# Altium footprint library Разъемы.PcbLib: 291 footprints (part 6 of 19)
Each footprint in its own frame and in the unit in brackets; x right, y up, seen from the top. Pads: shape width x height; smd on the part's side, far side on the other; paste and mask are expansions set on the pad; w line width, h text height; cw(c..) or ccw(c..) is an arc to the next point about the centre after c.
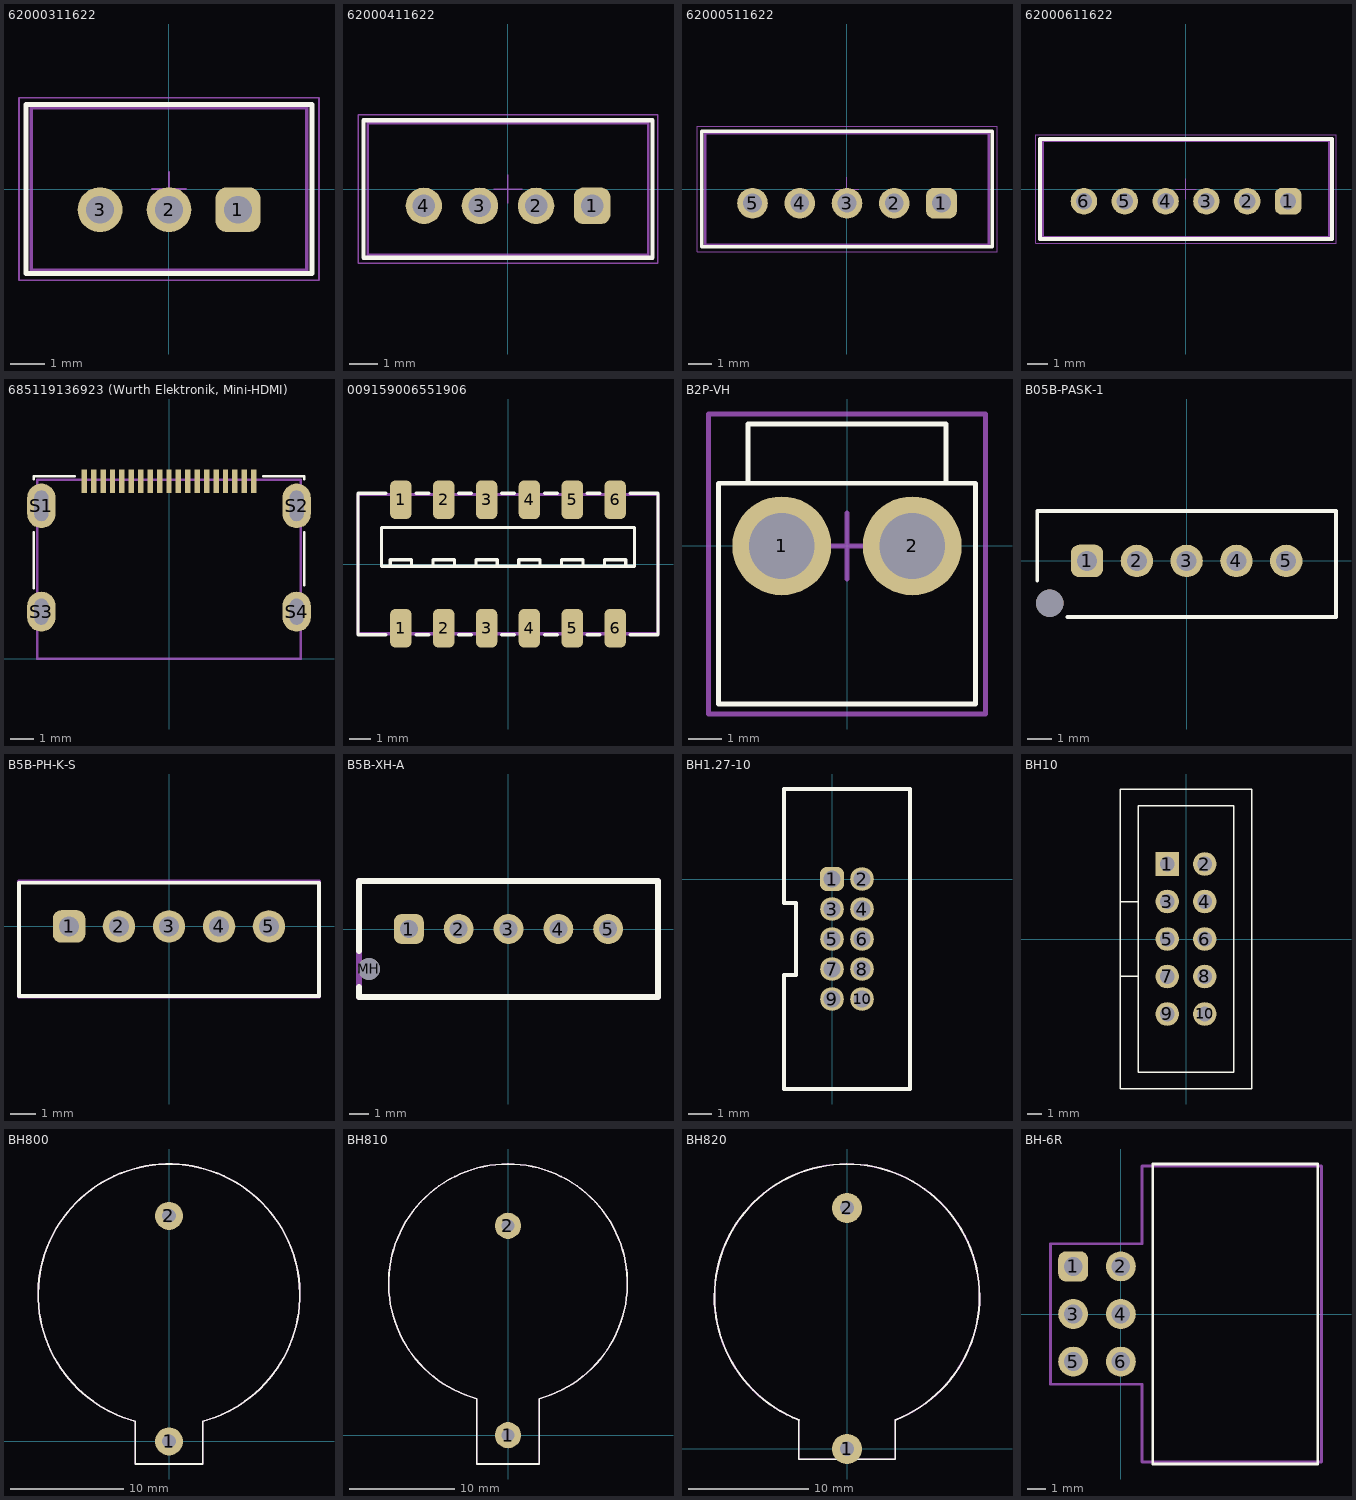
[diagram p5: the footprints below, top view; thin cyan lines are the x and y axes]

## 62000311622 [mm] "2.00mm Male Vertical Shrouded Header, 3p"
height 6.1
pads (3):
  rrect50% 1.3x1.3 hole 0.8: 1(2,-0.6)
  round 1.3 hole 0.8: 2(0,-0.6) 3(-2,-0.6)
Top Overlay:
  lines w0.15: -4.15,-2.45 -4.15,2.45 4.15,2.45 4.15,-2.45 -4.15,-2.45
  text "." at 2.5,-3 h0.1
Top Courtyard:
  lines w0.05: -0.5,0 0.5,0 ; 0,-0.5 0,0.5 ; -4.35,-2.65 -4.35,2.65 4.35,2.65 4.35,-2.65 -4.35,-2.65
Top Designator:
  text ".Designator" at -3.999,-0.679 h0.8
Top Component Outline:
  lines w0.1: -4,-2.35 4,-2.35 4,2.35 -4,2.35 -4,-2.35
3D body "62000311622.stp": height 6.13, standoff -3.37, extent -4,-2.35 4,2.35

## 62000411622 [mm] "2.00mm Male Vertical Shrouded Header, 4p"
height 6.1
pads (4):
  rrect50% 1.3x1.3 hole 0.8: 1(3,-0.6)
  round 1.3 hole 0.8: 2(1,-0.6) 3(-1,-0.6) 4(-3,-0.6)
Top Overlay:
  lines w0.15: -5.15,-2.45 5.15,-2.45 5.15,2.45 -5.15,2.45 -5.15,-2.45
  text "." at 4,-3 h0.1
Top Courtyard:
  lines w0.05: -0.5,0 0.5,0 ; 0,-0.5 0,0.5 ; -5.35,-2.65 5.35,-2.65 5.35,2.65 -5.35,2.65 -5.35,-2.65
Top Component Outline:
  lines w0.1: -5,-2.35 -5,2.35 5,2.35 5,-2.35 -5,-2.35
3D body "62000411622.stp": height 6.13, standoff -3.37, extent -5,-2.35 5,2.35

## 62000511622 [mm] "2.00mm Male Vertical Shrouded Header, 5p"
height 6.1
pads (5):
  rrect50% 1.3x1.3 hole 0.8: 1(4,-0.6)
  round 1.3 hole 0.8: 2(2,-0.6) 3(0,-0.6) 4(-2,-0.6) 5(-4,-0.6)
Top Overlay:
  lines w0.15: -6.15,-2.45 -6.15,2.45 6.15,2.45 6.15,-2.45 -6.15,-2.45
  text "." at 4.5,-3 h0.1
Top Courtyard:
  lines w0.05: -0.5,0 0.5,0 ; 0,-0.5 0,0.5 ; -6.35,-2.65 -6.35,2.65 6.35,2.65 6.35,-2.65 -6.35,-2.65
Top Designator:
  text ".Designator" at -3.999,-0.679 h0.8
Top Component Outline:
  lines w0.1: -6,-2.35 6,-2.35 6,2.35 -6,2.35 -6,-2.35
3D body "62000511622.stp": height 6.13, standoff -3.37, extent -6,-2.35 6,2.35

## 62000611622 [mm] "2.00mm Male Vertical Shrouded Header, 6p"
height 6.1
pads (6):
  rrect50% 1.3x1.3 hole 0.8: 1(5,-0.6)
  round 1.3 hole 0.8: 2(3,-0.6) 3(1,-0.6) 4(-1,-0.6) 5(-3,-0.6) 6(-5,-0.6)
Top Overlay:
  lines w0.2: -7.15,-2.45 -7.15,2.45 7.15,2.45 7.15,-2.45 -7.15,-2.45
  text "." at 5.5,-3.1 h0.1
Top Courtyard:
  lines w0.05: -0.5,0 0.5,0 ; 0,-0.5 0,0.5 ; -7.35,-2.65 -7.35,2.65 7.35,2.65 7.35,-2.65 -7.35,-2.65
Top Component Outline:
  lines w0.1: -7,-2.35 7,-2.35 7,2.35 -7,2.35 -7,-2.35
3D body "62000611622.stp": height 6.13, standoff -3.37, extent -7,-2.35 7,2.35

## 685119136923 (Wurth Elektronik, Mini-HDMI) [mm]
height 3.3
pads (23):
  rect 0.23x1 smd: 1(3.6,7.55) 2(3.2,7.55) 3(2.8,7.55) 4(2.4,7.55) 5(2,7.55) 6(1.6,7.55) 7(1.2,7.55) 8(0.8,7.55) 9(0.4,7.55) 10(0,7.55) 11(-0.4,7.55) 12(-0.8,7.55) 13(-1.2,7.55) 14(-1.6,7.55) 15(-2,7.55) 16(-2.4,7.55) 17(-2.8,7.55) 18(-3.2,7.55) 19(-3.6,7.55)
  oval 1.2x1.9 hole 0.6 slot 1.3 at 90 deg: S1(-5.425,6.5) S2(5.425,6.5)
  oval 1.2x1.7 hole 0.6 slot 1.1 at 90 deg: S3(-5.425,2) S4(5.425,2)
Top Overlay:
  lines w0.1: -5.75,3 -5.75,5.375 ; -5.75,7.625 -5.75,7.75 -4,7.75 ; 4,7.75 5.75,7.75 5.75,7.625 ; 5.75,3.125 5.75,5.375
Mechanical 1:
  lines w0.1: -5.6,0 5.6,0 5.6,7.6 -5.6,7.6 -5.6,0
3D body "685119136923_Download_STP_685119136923_rev1.stp": height 3.25, standoff -2.2, extent -5.625,0 5.625,7.902

## 009159006551906 [mm]
height 5
pads (12):
  rrect50% 1x1.8 smd: 1(-5,-3) 1(-5,3) 2(-3,-3) 2(-3,3) 3(-1,-3) 3(-1,3) 4(1,-3) 4(1,3) 5(3,-3) 5(3,3) 6(5,-3) 6(5,3)
Top Overlay:
  lines w0.15: -5.7,-3.3 -7,-3.3 -7,0.1 -7,3.3 -5.7,3.3 ; -5.487,-0.1 -5.5,-0.1 -5.5,0.2 -4.5,0.2 -4.5,-0.1 ; -4.3,-3.3 -3.7,-3.3 ; -4.3,3.3 -3.7,3.3 ; -3.5,-0.1 -3.5,0.2 -2.5,0.2 -2.5,-0.1 ; -2.3,-3.3 -1.7,-3.3 ; -2.3,3.3 -1.7,3.3 ; -1.5,-0.1 -1.5,0.2 -0.5,0.2 -0.5,-0.1 ; -0.3,-3.3 0.3,-3.3 ; -0.3,3.3 0.3,3.3 ; 0.5,-0.1 0.5,0.2 1.5,0.2 1.5,-0.1 ; 1.7,-3.3 2.3,-3.3 ; 1.7,3.3 2.3,3.3 ; 2.5,-0.1 2.5,0.2 3.5,0.2 3.5,-0.1 ; 3.7,-3.3 4.3,-3.3 ; 3.7,3.3 4.3,3.3 ; 4.5,-0.1 4.5,0.2 5.5,0.2 5.5,-0.1 ; 5.7,-3.3 7,-3.3 7,0.1 7,3.3 5.7,3.3 ; -5.9,-0.1 -5.9,1.7 0,1.7 5.9,1.7 5.9,-0.1 -0.2,-0.1 -5.9,-0.1
  text "." at -6.25,-4 h0.1
Top Courtyard:
  lines w0.15: -7,-3.25 -7,3.25 7,3.25 7,-3.25 -7,-3.25
Top Designator:
  text ".Designator" at -3.999,-0.316 h0.8
3D body "AVX-00-9159-006-551-906.STEP": height 5.1, standoff 0.05, extent -7,-3.75 7,3.75

## B2P-VH [mm]
height 11
pads (2):
  round 3 hole 2: 1(-1.98,0) 2(1.98,0)
Top Overlay:
  lines w0.15: -3,1.9 -3,3.7 3,3.7 3,1.9 ; -3.9,1.9 3.9,1.9 ; -3.9,1.9 -3.9,-4.8 3.9,-4.8 3.9,1.9 ; -3.9,1.9 3.9,1.9
  text "." at -2.5,-5.5 h0.1
Top Designator:
  text ".Designator" at -3.914,-0.817 h0.8
Mechanical 15:
  lines w0.15: -1,0 1,0 ; 0,-1 0,1 ; -4.2,-5.1 4.2,-5.1 4.2,4 -4.2,4 -4.2,-5.1
3D body "B2P-VH-BK.STEP": height 10.9, standoff -3.7, extent -3.93,-4.65 3.93,3.85

## B05B-PASK-1 [mm]
pads (6):
  rrect50% 1.3x1.3 hole 0.8: 1(-4,0)
  round 1.3 hole 0.8: 2(-2,0) 3(0,0) 4(2,0) 5(4,0)
  round 1.1 hole 1.1 unplated: ""(-5.5,-1.7)
Top Overlay:
  lines w0.15: -6,-0.8 -6,2 6,2 6,-2.25 -4.8,-2.25
  text "." at -4,-2.75 h0.1
Top Designator:
  text ".Designator" at -4.037,0.145 h0.8
3D body "B05B-PASK-1.STEP": height 7.85, standoff -2.85, extent -6,-2.2 6,3.1

## B5B-PH-K-S [mm]
pads (5):
  rrect50% 1.3x1.3 hole 0.8: 1(-4,0)
  round 1.3 hole 0.8: 2(-2,0) 3(0,0) 4(2,0) 5(4,0)
Top Overlay:
  lines w0.15: -6,-2.775 6,-2.775 6,1.75 -6,1.75 -6,-2.775
  text "." at -4,2.25 h0.1
Top Courtyard:
  lines w0.15: -6,-2.8 -6,1.8 6,1.8 6,-2.8 -6,-2.8
Top Designator:
  text ".Designator" at -3.999,-0.767 h0.8
3D body "B5B-PH-K-S.STEP": height 6, standoff -3.4, extent -5.95,-2.75 5.95,1.75

## B5B-XH-A [mm]
pads (6):
  rrect50% 1.5x1.5 hole 0.9: 1(-5,0)
  round 1.5 hole 0.9: 2(-2.5,0) 3(0,0) 4(2.5,0) 5(5,0)
  round 1.1 hole 1.1 unplated: MH(-7,-2)
Top Overlay:
  lines w0.3: -7.5,-2.9 -7.5,-3.4 7.5,-3.4 7.5,2.4 -7.5,2.4 -7.5,-1.1
  text "." at -5,3 h0.1
Top Courtyard:
  lines w0.3: -7.5,-3.4 7.5,-3.4 7.5,2.4 -7.5,2.4 -7.5,-3.4
Top Designator:
  text ".Designator" at -4,-0.767 h0.8
3D body "B5B-XH-A.STEP": height 7, standoff -3.4, extent -7.45,-3.375 7.45,2.375

## BH1.27-10 [mm] "BH1.27-10"
pads (10):
  rrect50% 1x1 hole 0.7: 1(0,0)
  round 1 hole 0.7: 2(1.27,0) 3(0,-1.27) 4(1.27,-1.27) 5(0,-2.54) 6(1.27,-2.54) 7(0,-3.81) 8(1.27,-3.81) 9(0,-5.08) 10(1.27,-5.08)
Top Overlay:
  lines w0.15: -2.032,-8.89 3.302,-8.89 3.302,3.81 -2.032,3.81 -2.032,-1.016 -1.524,-1.016 -1.524,-4.064 -2.032,-4.064 -2.032,-8.89
  text "." at -2.5,0.5 h0.1
Top Designator:
  text ".Designator" at -3.364,-2.807 h0.8
3D body "CONB127P-2R-10W_TH.STEP": height 5.4, standoff -2.1, extent -2.015,-8.865 3.185,3.785

## BH10 [mm]
height 8.75
pads (10):
  rect 1.6x1.6 hole 1: 1(-1.27,5.08)
  round 1.6 hole 1: 2(1.27,5.08) 3(-1.27,2.54) 4(1.27,2.54) 5(-1.27,0) 6(1.27,0) 7(-1.27,-2.54) 8(1.27,-2.54) 9(-1.27,-5.08) 10(1.27,-5.08)
Top Overlay:
  lines w0.1: -4.47,-2.54 -3.25,-2.54 ; -4.47,2.54 -3.25,2.54 ; -4.47,-10.16 -4.47,10.16 4.47,10.16 4.47,-10.16 -4.47,-10.16 ; -3.25,-9.01 3.25,-9.01 3.25,9.01 -3.25,9.01 -3.25,-9.01
3D body "BH-10.STEP": height 8.75, standoff -3.1, extent -4.475,-10.16 4.475,10.16

## BH800 [mm]
height 6.6
pads (2):
  round 2.5 hole 1.2: 1(0,0) 2(0,20)
Top Overlay:
  lines w0.15: -3.001,1.795 cw(c0,13) 3.001,1.795 ; -3,1.8 -3,-2 3,-2 3,1.8
Top Courtyard:
  lines w0.15: -3.001,1.795 cw(c0,13) 3.001,1.795 ; -3,1.8 -3,-2 3,-2 3,1.8
Top Designator:
  text ".Designator" at -3.999,11.033 h0.8
3D body: height 8.2, standoff 0, extent -3,-2 3,3.5
3D body: height 8.2, standoff 0, extent -11.6,1.4 11.6,24.6

## BH810 [mm]
height 6.6
pads (2):
  round 2.5 hole 1.2: 1(0,0) 2(0,20)
Top Overlay:
  lines w0.15: -3,3.5 -3,-2.75 3,-2.75 3,3.5 ; -3,3.502 cw(c0,14.5) 3,3.502
Top Courtyard:
  lines w0.15: -3,3.5 -3,-2.75 3,-2.75 3,3.5 ; -3,3.502 cw(c0,14.5) 3,3.502
Top Designator:
  text ".Designator" at -3.999,11.308 h0.8
3D body "User Library-BATTERY HOLDER CR2032.step": height 7.41, standoff -3.5, extent -11.5,-2.75 11.5,25.75

## BH820 [mm]
height 6.6
pads (2):
  round 2.5 hole 1.2: 1(0,0) 2(0,20)
Top Overlay:
  lines w0.15: -4,2.35 -4,-0.85 4,-0.85 4,2.35 ; -3.982,2.396 cw(c0,12.65) 4.016,2.409
Top Courtyard:
  lines w0.15: -4,2.396 -4,-0.85 4,-0.85 4,2.396 ; -3.998,2.402 cw(c0,12.65) 3.998,2.402
Top Designator:
  text ".Designator" at -3.999,10.92 h0.8
3D body: height 8.5, standoff 0, extent -4,-0.847 4,2.353
3D body: height 8.5, standoff 0, extent -11.4,0.75 11.4,23.55

## BH-6R [mm] "BH-6R(IDC-6R)"
height 7
pads (6):
  rrect50% 1.6x1.6 hole 1: 1(-2.54,2.54)
  round 1.6 hole 1: 2(0,2.54) 3(-2.54,0) 4(0,0) 5(-2.54,-2.54) 6(0,-2.54)
Top Overlay:
  lines w0.15: 1.7,-8 1.7,8 10.5,8 10.5,-8 1.7,-8
  text "." at -3.2,3.9 h0.1
Top Courtyard:
  lines w0.15: -3.75,-3.75 1.125,-3.75 1.125,-7.9 10.7,-7.9 10.7,0 10.7,7.9 1.125,7.9 1.125,3.75 -3.75,3.75 -3.75,0 -3.75,-3.75
3D body "User Library-IDC Socket Male 6pin Angled THT Goldplated 2_54mm.step": height 8.85, standoff -2.5, extent -2.86,-7.93 10.7,7.93